# Altium footprint library My Library.PcbLib: 872 footprints (part 29 of 55)
Each footprint in its own frame and in the unit in brackets; x right, y up, seen from the top. Pads: shape width x height; smd on the part's side, far side on the other; paste and mask are expansions set on the pad; w line width, h text height; cw(c..) or ccw(c..) is an arc to the next point about the centre after c.
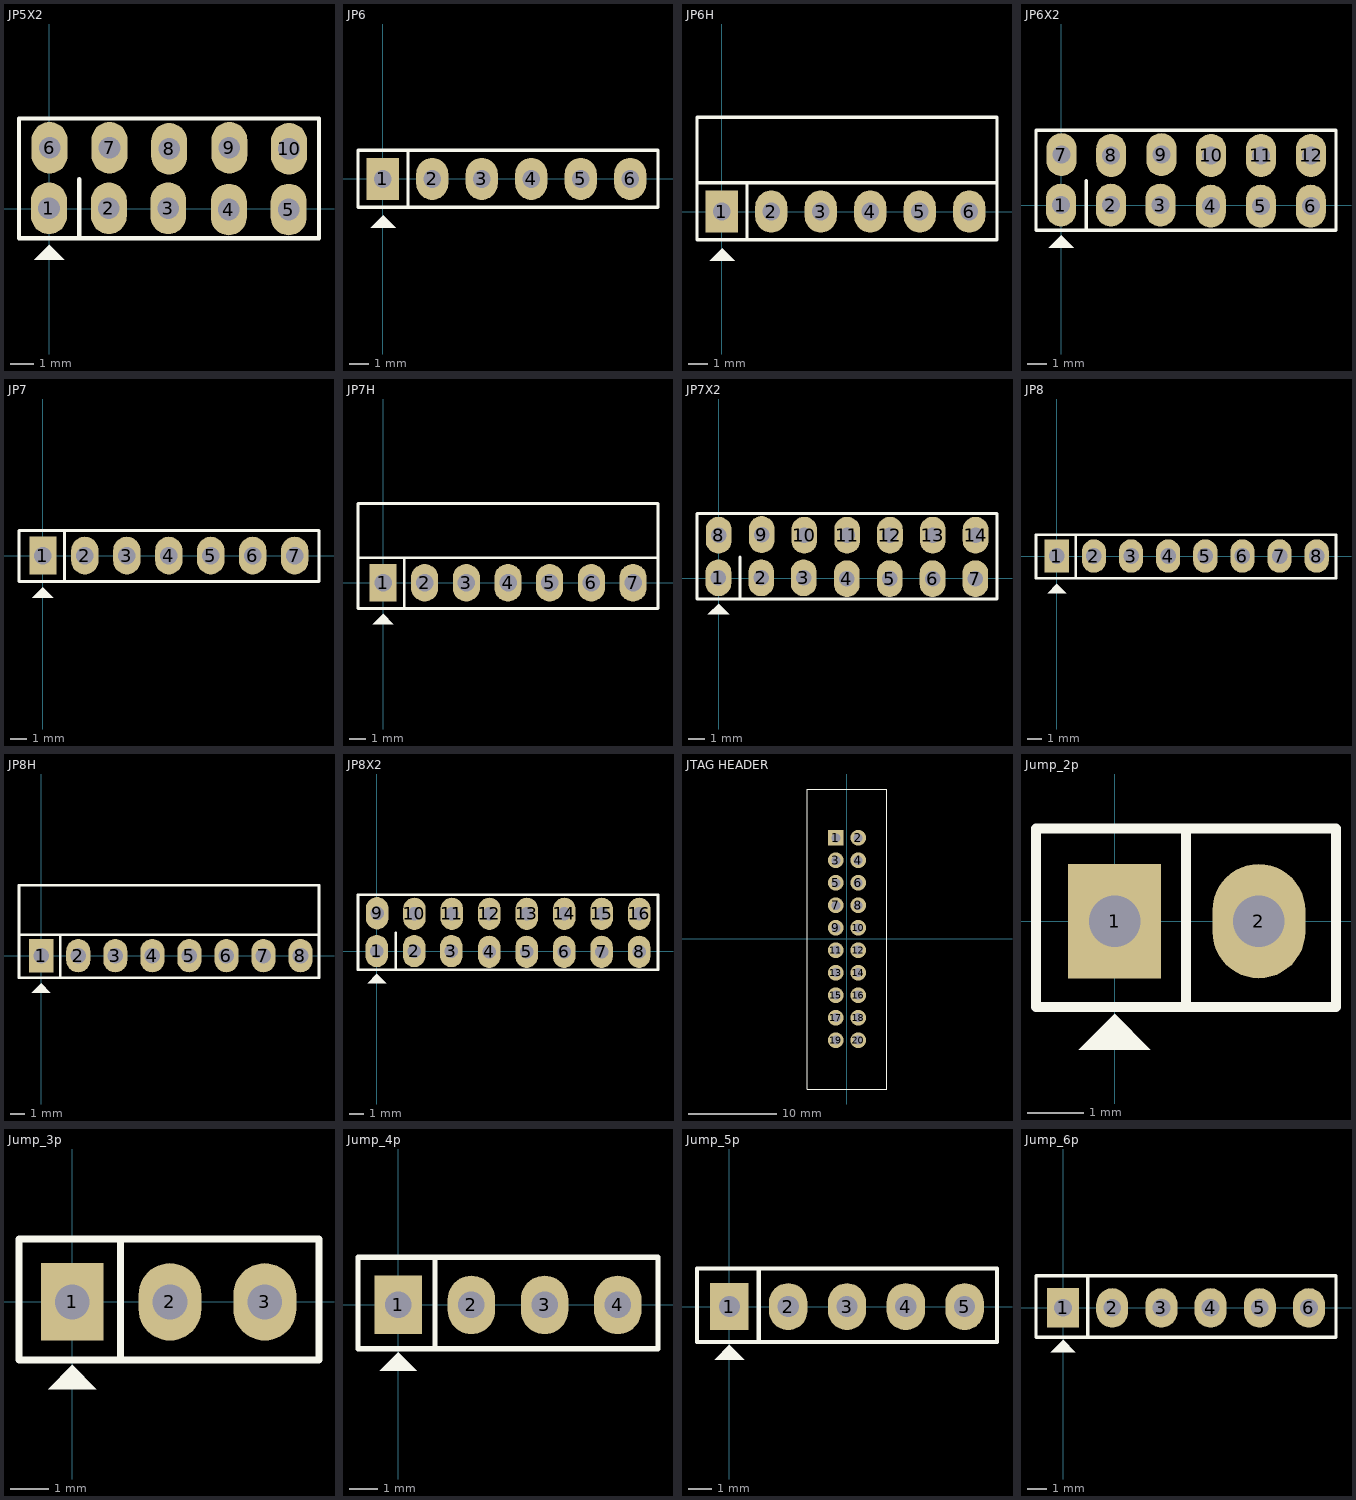
[diagram p28: the footprints below, top view; thin cyan lines are the x and y axes]

## JP5X2 [mil]
pads (10):
  oval 60x86 hole 36: 1(-0.5,0.5) 2(99.5,0.5) 3(198.5,0.5) 4(299.5,-1.5) 5(399.5,-1.5) 6(0.5,101.5) 7(100.5,101.5) 8(200,100) 9(300.5,101.5) 10(400,100)
Top Overlay:
  region: 0,-60 -25,-85 25,-85
  lines w7: 50,-49 50,49 ; -50.5,-49.5 450,-49.5 450,150.5 -50.5,150.5 -50.5,50.5 -50.5,-49.5
3D body "JP5X2.stp": height 335.25, standoff -117.51, extent -49.99,-49.99 450.01,150.01

## JP6 [mil] "JP6"
height 200
pads (6):
  rect 65x85 hole 36: 1(0,0)
  oval 65x85 hole 36: 2(100,0) 3(200,0) 4(300,0) 5(400,0) 6(500,0)
Top Overlay:
  region: 1,-74 -24,-99 26,-99
  lines w7: 51,-57 51,56 ; -50,-57 556,-57 556,58 -50,58 -50,-57
3D body "JP1-6.stp": height 323.43, standoff -117.51, extent -48.03,-50 548.03,48.43

## JP6H [mil]
pads (6):
  rect 65x85 hole 36: 1(0,0)
  oval 65x85 hole 36: 2(100,0) 3(200,0) 4(300,0) 5(400,0) 6(500,0)
Top Overlay:
  region: 1,-74 -24,-99 26,-99
  lines w7: 51,-57 51,56 ; -50,58 -50,190 556,190 556,58 ; -50,58 556,58 ; -50,58 -50,-57 556,-57 556,58
3D body "JP6H.stp": height 99.03, standoff -93.89, extent -46.06,-14.96 546.07,423.63

## JP6X2 [mil]
pads (12):
  oval 60x86 hole 36: 1(-0.5,0.5) 2(99.5,0.5) 3(198.5,0.5) 4(299.5,-1.5) 5(399.5,-1.5) 6(499.5,-1.5) 7(0.5,101.5) 8(100,100) 9(200.5,101.5) 10(300,100) 11(400,100) 12(500,100)
Top Overlay:
  region: 0,-60 -25,-85 25,-85
  lines w7: 50,-49 50,49 ; -50.5,-49.5 -50.5,50.5 -50.5,150.5 550,150.5 550,-49.5 -50.5,-49.5
3D body "JP6X2.stp": height 335.24, standoff -117.51, extent -49.99,-49.99 550.01,150.01

## JP7 [mil] "JP7"
height 200
pads (7):
  rect 65x90 hole 42: 1(0,0)
  oval 65x90 hole 42: 2(100,0) 3(200,0) 4(300,0) 5(400,0) 6(500,0) 7(600,0)
Top Overlay:
  region: 0,-75 -25,-100 25,-100
  lines w7: 51,-58 51,60 ; -57,-62 -57,60 658,60 658,-62 -57,-62
3D body "JP1-7.stp": height 323.44, standoff -117.51, extent -50,-49.21 646.06,49.21

## JP7H [mil]
pads (7):
  rect 65x90 hole 42: 1(0,0)
  oval 65x90 hole 42: 2(100,0) 3(200,0) 4(300,0) 5(400,0) 6(500,0) 7(600,0)
Top Overlay:
  region: 0,-75 -25,-100 25,-100
  lines w7: -57,60 660,60 ; -50,60 -60,60 ; 51,-58 51,60 ; -60,60 -60,190 660,190 660,60 ; -60,60 -60,-62 660,-62 660,60
3D body "JP7H.stp": height 99.03, standoff -93.89, extent -46.06,-24.96 646.07,413.63

## JP7X2 [mil]
pads (14):
  oval 60x86 hole 36: 1(-0.5,0.5) 2(99.5,0.5) 3(198.5,0.5) 4(299.5,-1.5) 5(399.5,-1.5) 6(499.5,-1.5) 7(599.5,-1.5) 8(0,100) 9(100.5,101.5) 10(200,100) 11(300,100) 12(400,100) 13(500,100) 14(600,100)
Top Overlay:
  region: 0,-60 -25,-85 25,-85
  lines w7: 50,-49 50,49 ; -50.5,-49.5 -50.5,50.5 -50.5,150.5 650,150.5 650,-49.5 -50.5,-49.5
3D body "JP7X2.stp": height 335.25, standoff -117.51, extent -49.99,-49.99 650.01,150.01

## JP8 [mil] "JP8"
height 200
pads (8):
  rect 65x90 hole 42: 1(0,0)
  oval 65x90 hole 42: 2(100,0) 3(200,0) 4(300,0) 5(400,0) 6(500,0) 7(600,0) 8(700,0)
Top Overlay:
  region: 0,-75 -25,-100 25,-100
  lines w7: 51,-60 51,56 ; -56,-60 -56,57 752,57 752,-60 -56,-60
3D body "JP1-8.stp": height 323.43, standoff -117.51, extent -48.03,-50 748.03,48.43

## JP8H [mil]
pads (8):
  rect 65x90 hole 42: 1(0,0)
  oval 65x90 hole 42: 2(100,0) 3(200,0) 4(300,0) 5(400,0) 6(500,0) 7(600,0) 8(700,0)
Top Overlay:
  region: 0,-75 -25,-100 25,-100
  lines w7: 51,-60 51,56 ; -60,57 -60,-60 750,-60 750,57 ; -60,57 750,57 ; -60,57 -60,190 750,190 750,57
3D body "JP8H.stp": height 49.21, standoff -143.7, extent -46.06,-14.96 746.06,423.62

## JP8X2 [mil]
pads (16):
  oval 60x86 hole 36: 1(-0.5,0.5) 2(99.5,0.5) 3(198.5,0.5) 4(299.5,-1.5) 5(399.5,-1.5) 6(499.5,-1.5) 7(599.5,-1.5) 8(699.5,-1.5) 9(0.5,101.5) 10(100,100) 11(200,100) 12(300,100) 13(400,100) 14(500,100) 15(600,100) 16(700,100)
Top Overlay:
  region: 0,-60 -25,-85 25,-85
  lines w7: 50,-49 50,49 ; -50.5,-49.5 -50.5,50.5 -50.5,150.5 750,150.5 750,-49.5 -50.5,-49.5
3D body "JP8X2.stp": height 335.25, standoff -117.51, extent -49.99,-49.99 750.01,150.01

## JTAG HEADER [mil]
pads (20):
  rect 70x70 hole 40: 1(-49,449)
  round 70 hole 40: 2(51,449) 3(-49,349) 4(51,349) 5(-49,249) 6(51,249) 7(-49,149) 8(51,149) 9(-49,49) 10(51,49) 11(-49,-51) 12(51,-51) 13(-49,-151) 14(51,-151) 15(-49,-251) 16(51,-251) 17(-49,-351) 18(51,-351) 19(-49,-451) 20(51,-451)
Top Overlay:
  lines w4: -66,665.85 9,665.85 ; -176.48,-667.85 178.48,-667.85 178.48,665.85 -176.48,665.85 -176.48,-667.85
3D body: height 196.85, standoff 0, extent -160,-100 -140,100
3D body: height 39.37, standoff 0, extent -140,-630 145,630
3D body: height 314.96, standoff -39.37, extent -68.98,429.02 -29.02,468.98
3D body: height 314.96, standoff -39.37, extent 31.02,429.02 70.98,468.98
3D body: height 314.96, standoff -39.37, extent -68.98,329.02 -29.02,368.98
3D body: height 314.96, standoff -39.37, extent 31.02,329.02 70.98,368.98
3D body: height 314.96, standoff -39.37, extent 31.02,229.02 70.98,268.98
3D body: height 314.96, standoff -39.37, extent -68.98,229.02 -29.02,268.98
3D body: height 314.96, standoff -39.37, extent -68.98,129.02 -29.02,168.98
3D body: height 314.96, standoff -39.37, extent 31.02,129.02 70.98,168.98
3D body: height 314.96, standoff -39.37, extent -68.98,29.02 -29.02,68.98
3D body: height 314.96, standoff -39.37, extent 31.02,29.02 70.98,68.98
3D body: height 314.96, standoff -39.37, extent -68.98,-70.98 -29.02,-31.02
3D body: height 314.96, standoff -39.37, extent 31.02,-70.98 70.98,-31.02
3D body: height 314.96, standoff -39.37, extent -68.98,-170.98 -29.02,-131.02
3D body: height 314.96, standoff -39.37, extent 31.02,-170.98 70.98,-131.02
3D body: height 314.96, standoff -39.37, extent -68.98,-270.98 -29.02,-231.02
3D body: height 314.96, standoff -39.37, extent 31.02,-270.98 70.98,-231.02
3D body: height 314.96, standoff -39.37, extent 31.02,-370.98 70.98,-331.02
3D body: height 314.96, standoff -39.37, extent -68.98,-370.98 -29.02,-331.02
3D body: height 314.96, standoff -39.37, extent -69.98,-469.98 -30.02,-430.02
3D body: height 314.96, standoff -39.37, extent 31.02,-470.98 70.98,-431.02
3D body: height 354.33, standoff 0, extent -160,-647.85 158.48,645.85

## Jump_2p [mil]
pads (2):
  rect 65x80 hole 36: 1(0,0)
  oval 65x80 hole 36: 2(101,0)
Top Overlay:
  region: 0,-65 -25,-90 25,-90
  lines w7: 50,-60 50,65 ; -55,-60 155,-60 155,65 -55,65 -55,-60
3D body "JP2.stp": height 323.44, standoff -117.51, extent -49.99,-49.21 146.07,49.22

## Jump_3p [mil]
pads (3):
  rect 65x80 hole 36: 1(0,0)
  oval 65x80 hole 36: 2(101,0) 3(199,0)
Top Overlay:
  region: 0,-65 -25,-90 25,-90
  lines w7: 50,-60 50,65 ; -55,-60 -55,65 255,65 255,-60 -55,-60
3D body "JP2.stp": height 323.44, standoff -117.51, extent -49.99,-49.21 146.07,49.22
3D body "JP2.stp": height 323.44, standoff -117.51, extent 51.01,-49.21 247.07,49.22

## Jump_4p [mil]
pads (4):
  rect 65x80 hole 36: 1(0,0)
  oval 65x80 hole 36: 2(100,0) 3(200,0) 4(300,0)
Top Overlay:
  region: 0,-65 -25,-90 25,-90
  lines w7: 50,-60 50,65 ; -55,-60 -55,65 355,65 355,-60 -55,-60
3D body "JP4.stp": height 323.44, standoff -117.51, extent -49.99,-49.21 346.07,49.22

## Jump_5p [mil]
pads (5):
  rect 65x80 hole 36: 1(0,0)
  oval 65x80 hole 36: 2(100,0) 3(200,0) 4(300,0) 5(400,0)
Top Overlay:
  region: 0,-65 -25,-90 25,-90
  lines w7: 50,-60 50,65 ; -55,-60 -55,65 455,65 455,-60 -55,-60
3D body "JP1-5.stp": height 323.43, standoff -117.51, extent -49.99,-49.2 446.07,49.22

## Jump_6p [mil]
pads (6):
  rect 65x80 hole 36: 1(0,0)
  oval 65x80 hole 36: 2(100,0) 3(200,0) 4(300,0) 5(400,0) 6(500,0)
Top Overlay:
  region: 0,-65 -25,-90 25,-90
  lines w7: 50,-60 50,65 ; -55,-60 -55,65 555,65 555,-60 -55,-60
3D body "JP1-6.stp": height 323.43, standoff -117.51, extent -49.99,-49.21 546.07,49.22